# Altium footprint library IC.PcbLib: 220 footprints (part 10 of 14)
Each footprint in its own frame and in the unit in brackets; x right, y up, seen from the top. Pads: shape width x height; smd on the part's side, far side on the other; paste and mask are expansions set on the pad; w line width, h text height; cw(c..) or ccw(c..) is an arc to the next point about the centre after c.
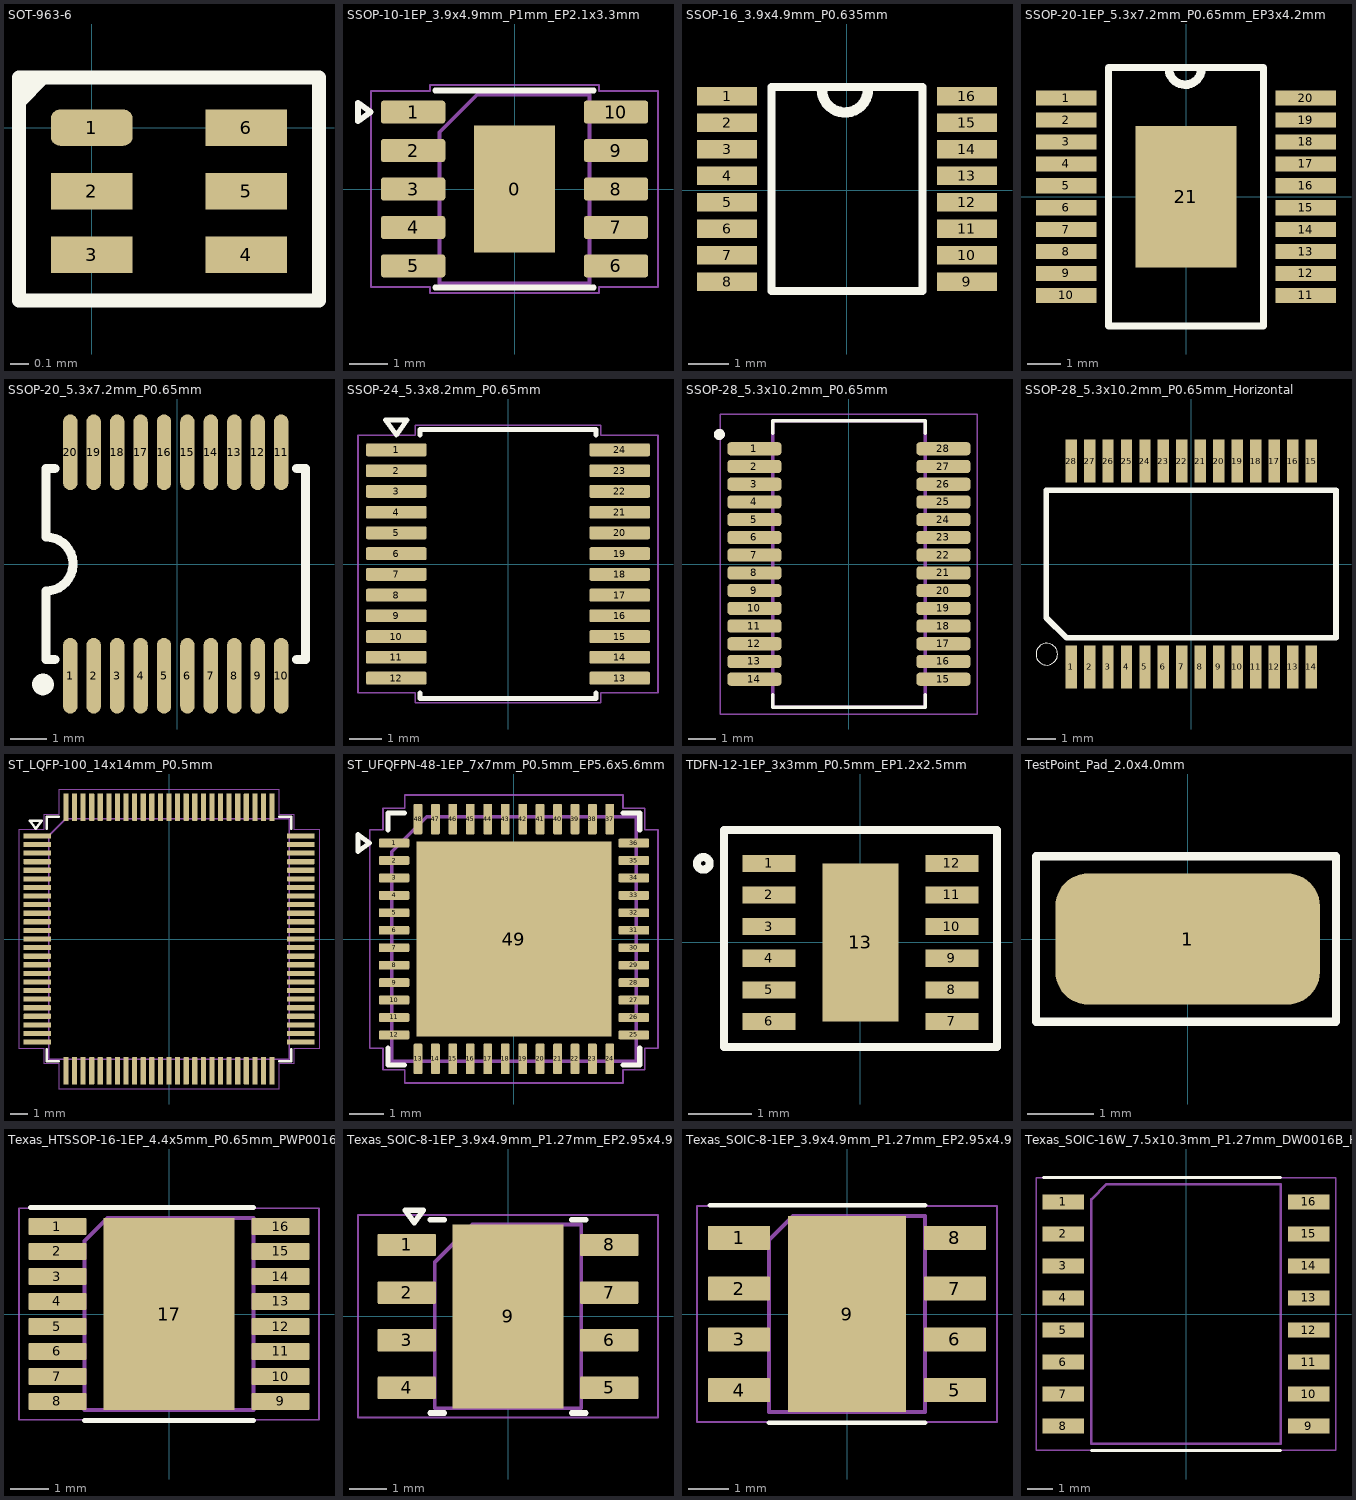
[diagram p9: the footprints below, top view; thin cyan lines are the x and y axes]

## SOT-963-6 [mm] "SOT-963 6-pin ultra-small package, pitch 0.35mm"
height 0.4
pads (6):
  rrect50% 0.45x0.2 smd paste+0 mask+0.051: 1(0,0)
  rect 0.45x0.2 smd paste+0 mask+0.051: 2(0,-0.35) 3(0,-0.7) 4(0.85,-0.7) 5(0.85,-0.35) 6(0.85,0)
Top Overlay:
  region: -0.4,0.275 -0.216,0.275 -0.4,0.091
  lines w0.076: -0.4,-0.95 -0.4,0.275 1.25,0.275 1.25,-0.95 -0.4,-0.95
3D body "SOT-963-6.step": height 0.5, standoff 0, extent -0.18,-0.85 1.03,0.15

## SSOP-10-1EP_3.9x4.9mm_P1mm_EP2.1x3.3mm [mm] "CH224K, USB PD sink controller — IC kích điện áp sạc nhanh USB PD [IC kich dien ap sac nhanh USB PD]"
height 1.55
pads (11):
  rect 2.1x3.3 smd paste-3.3: 0(0,0)
  rrect25% 1.675x0.6 smd: 1(-2.638,2) 2(-2.638,1) 3(-2.638,0) 4(-2.638,-1) 5(-2.638,-2) 6(2.638,-2) 7(2.638,-1) 8(2.638,0) 9(2.638,1) 10(2.638,2)
Top Overlay:
  lines w0.15: -2.06,-2.56 2.06,-2.56 ; -2.06,2.56 2.06,2.56 ; -4.07,1.76 -3.74,2 -4.07,2.24 -4.07,1.76
Top Paste:
  region: -0.845,-1.33 0.845,-1.33 0.845,1.33 -0.845,1.33
Mechanical 2:
  lines w0.1: -1.95,-2.45 1.95,-2.45 1.95,2.45 -0.975,2.45 -1.95,1.475 -1.95,-2.45
Mechanical 4:
  lines w0.05: -3.73,-2.55 -3.73,2.55 -2.2,2.55 -2.2,2.7 2.2,2.7 2.2,2.55 3.73,2.55 3.73,-2.55 2.2,-2.55 2.2,-2.7 -2.2,-2.7 -2.2,-2.55 -3.73,-2.55
3D body "SSOP-10-1EP_3.9x4.9mm_P1mm_EP2.1x3.3mm.step": height 0, standoff 0, extent -3.475,-2.3 3.475,2.3

## SSOP-16_3.9x4.9mm_P0.635mm [mm] "SSOP-16 / QSOP-16 (DBQ), body 3.9x4.9mm, pitch 0.635mm"
height 2.65
pads (16):
  rect 1.475x0.45 smd: 1(-2.938,2.3) 2(-2.938,1.65) 3(-2.938,1) 4(-2.938,0.35) 5(-2.938,-0.3) 6(-2.938,-0.95) 7(-2.938,-1.6) 8(-2.938,-2.25) 9(2.938,-2.25) 10(2.938,-1.6) 11(2.938,-0.95) 12(2.938,-0.3) 13(2.938,0.35) 14(2.938,1) 15(2.938,1.65) 16(2.938,2.3)
Top Overlay:
  lines w0.2: -1.85,-2.475 -1.85,2.525 1.85,2.525 1.85,-2.475 -1.85,-2.475
  lines w0.254: -0.615,2.464 ccw(c-0.051,2.464) 0.513,2.483
3D body "NPIC6C596APWJ.stp": height 1.1, standoff 0, extent -3.2,-2.474 3.2,2.526

## SSOP-20-1EP_5.3x7.2mm_P0.65mm_EP3x4.2mm [mm] "SSOP-20 with exposed pad 3.0x4.2mm, pitch 0.65mm"
height 1.1
pads (21):
  rect 1.8x0.45 smd mask+0.076: 1(-3.55,2.925) 2(-3.55,2.275) 3(-3.55,1.625) 4(-3.55,0.975) 5(-3.55,0.325) 6(-3.55,-0.325) 7(-3.55,-0.975) 8(-3.55,-1.625) 9(-3.55,-2.275) 10(-3.55,-2.925) 11(3.55,-2.925) 12(3.55,-2.275) 13(3.55,-1.625) 14(3.55,-0.975) 15(3.55,-0.325) 16(3.55,0.325) 17(3.55,0.975) 18(3.55,1.625) 19(3.55,2.275) 20(3.55,2.925)
  rect 3x4.2 smd: 21(0,0)
Top Overlay:
  lines w0.2: -2.3,-3.835 -2.3,3.835 2.3,3.835 2.3,-3.835 -2.3,-3.835
  lines w0.254: -0.51,3.783 ccw(c-0.025,3.81) 0.458,3.768
3D body "MTCH108-I_SS.stp": height 2, standoff 0, extent -3.9,-3.6 3.9,3.6

## SSOP-20_5.3x7.2mm_P0.65mm [mm] "SSOP-20, body 5.3x7.2mm, pitch 0.65mm"
pads (20):
  oval 0.4x2.1 smd: 1(-2.973,-3.1) 2(-2.322,-3.1) 3(-1.672,-3.1) 4(-1.022,-3.1) 5(-0.372,-3.1) 6(0.279,-3.1) 7(0.929,-3.1) 8(1.579,-3.1) 9(2.229,-3.1) 10(2.879,-3.1) 11(2.879,3.1) 12(2.229,3.1) 13(1.579,3.1) 14(0.929,3.1) 15(0.279,3.1) 16(-0.372,3.1) 17(-1.022,3.1) 18(-1.672,3.1) 19(-2.322,3.1) 20(-2.973,3.1)
Top Overlay:
  lines w0.254: -3.647,-0.75 -3.647,-2.65 -3.404,-2.65 ; -3.646,-0.749 ccw(c-3.646,0) -3.647,0.75 -3.647,2.65 -3.404,2.65 ; 3.311,-2.65 3.553,-2.65 3.553,2.65 3.311,2.65
  lines w0.3: -3.841,-3.444 cw(c-3.73,-3.343) -3.831,-3.454
3D body "SSOP20L-150-0.64.STEP": height 1.63, standoff 0, extent -3.725,-2.997 3.725,2.997

## SSOP-24_5.3x8.2mm_P0.65mm [mm] "SSOP-24 5.3x8.2mm pitch 0.65mm (TB6612FNG)"
height 2.1
pads (24):
  rrect25% 1.9x0.4 smd: 1(-3.5,3.575) 2(-3.5,2.925) 3(-3.5,2.275) 4(-3.5,1.625) 5(-3.5,0.975) 6(-3.5,0.325) 7(-3.5,-0.325) 8(-3.5,-0.975) 9(-3.5,-1.625) 10(-3.5,-2.275) 11(-3.5,-2.925) 12(-3.5,-3.575) 13(3.5,-3.575) 14(3.5,-2.925) 15(3.5,-2.275) 16(3.5,-1.625) 17(3.5,-0.975) 18(3.5,-0.325) 19(3.5,0.325) 20(3.5,0.975) 21(3.5,1.625) 22(3.5,2.275) 23(3.5,2.925) 24(3.5,3.575)
Top Overlay:
  lines w0.15: -2.76,-4.035 -2.76,-4.21 2.76,-4.21 2.76,-4.035 ; -2.76,4.035 -2.76,4.21 2.76,4.21 2.76,4.035 ; -3.84,4.51 -3.5,4.04 -3.16,4.51 -3.84,4.51
Mechanical 4:
  lines w0.05: -4.7,-4.03 -4.7,4.03 -2.9,4.03 -2.9,4.35 2.9,4.35 2.9,4.03 4.7,4.03 4.7,-4.03 2.9,-4.03 2.9,-4.35 -2.9,-4.35 -2.9,-4.03 -4.7,-4.03
3D body "SSOP-24_5.3x8.2mm_P0.65mm.step": height 2.1, standoff 0, extent -3.9,-4.1 3.9,4.1

## SSOP-28_5.3x10.2mm_P0.65mm [mm] "SSOP-28, body 5.3x10.2mm, pitch 0.65mm (WM8731)"
pads (28):
  rrect50% 1.98x0.48 smd: 1(-3.465,4.225) 2(-3.465,3.575) 3(-3.465,2.925) 4(-3.465,2.275) 5(-3.465,1.625) 6(-3.465,0.975) 7(-3.465,0.325) 8(-3.465,-0.325) 9(-3.465,-0.975) 10(-3.465,-1.625) 11(-3.465,-2.275) 12(-3.465,-2.925) 13(-3.465,-3.575) 14(-3.465,-4.225) 15(3.465,-4.225) 16(3.465,-3.575) 17(3.465,-2.925) 18(3.465,-2.275) 19(3.465,-1.625) 20(3.465,-0.975) 21(3.465,-0.325) 22(3.465,0.325) 23(3.465,0.975) 24(3.465,1.625) 25(3.465,2.275) 26(3.465,2.925) 27(3.465,3.575) 28(3.465,4.225)
Top Overlay:
  circle w0.2: c-4.75,4.75 r0.1
  lines w0.127: -2.8,-4.8 -2.8,-5.25 2.8,-5.25 2.8,-4.8 ; -2.8,4.8 -2.8,5.25 2.8,5.25 2.8,4.8
Mechanical 13:
  circle w0.2: c-4.75,4.75 r0.1
  lines w0.127: -2.8,-5.25 2.8,-5.25 2.8,5.25 -2.8,5.25 -2.8,-5.25
Mechanical 15:
  lines w0.05: -4.71,-5.5 4.71,-5.5 4.71,5.5 -4.71,5.5 -4.71,-5.5
3D body "step_temp.STEP": height 2, standoff 0, extent -3.9,-5.1 3.9,5.1

## SSOP-28_5.3x10.2mm_P0.65mm_Horizontal [mm] "SSOP-28 rotated 90deg, body 5.3x10.2mm, pitch 0.65mm (FT232RL)"
pads (28):
  rect 0.4x1.5 smd: 1(-4.225,-3.625) 2(-3.575,-3.625) 3(-2.925,-3.625) 4(-2.275,-3.625) 5(-1.625,-3.625) 6(-0.975,-3.625) 7(-0.325,-3.625) 8(0.325,-3.625) 9(0.975,-3.625) 10(1.625,-3.625) 11(2.275,-3.625) 12(2.925,-3.625) 13(3.575,-3.625) 14(4.225,-3.625) 15(4.225,3.625) 16(3.575,3.625) 17(2.925,3.625) 18(2.275,3.625) 19(1.625,3.625) 20(0.975,3.625) 21(0.325,3.625) 22(-0.325,3.625) 23(-0.975,3.625) 24(-1.625,3.625) 25(-2.275,3.625) 26(-2.925,3.625) 27(-3.575,3.625) 28(-4.225,3.625)
Top Overlay:
  circle w0: c-5.08,-3.175 r0.381
  lines w0.203: -5.1,-1.89 -5.1,2.6 5.1,2.6 5.1,-2.6 -4.39,-2.6 -5.1,-1.89
3D body "FT232RL--3DModel-STEP-56544.STEP": height 2, standoff 0, extent -5.1,-3.9 5.1,3.9

## ST_LQFP-100_14x14mm_P0.5mm [mm] "STM32H743VIT6, Cortex-M7 MCU with 2 MB flash — Vi điều khiển Cortex-M7, flash 2 MB [Vi dieu khien Cortex-M7, flash 2 MB]"
height 1.4
pads (100):
  rrect25% 1.6x0.3 smd: 1(-7.675,6) 2(-7.675,5.5) 3(-7.675,5) 4(-7.675,4.5) 5(-7.675,4) 6(-7.675,3.5) 7(-7.675,3) 8(-7.675,2.5) 9(-7.675,2) 10(-7.675,1.5) 11(-7.675,1) 12(-7.675,0.5) 13(-7.675,0) 14(-7.675,-0.5) 15(-7.675,-1) 16(-7.675,-1.5) 17(-7.675,-2) 18(-7.675,-2.5) 19(-7.675,-3) 20(-7.675,-3.5) 21(-7.675,-4) 22(-7.675,-4.5) 23(-7.675,-5) 24(-7.675,-5.5) 25(-7.675,-6) 51(7.675,-6) 52(7.675,-5.5) 53(7.675,-5) 54(7.675,-4.5) 55(7.675,-4) 56(7.675,-3.5) 57(7.675,-3) 58(7.675,-2.5) 59(7.675,-2) 60(7.675,-1.5) 61(7.675,-1) 62(7.675,-0.5) 63(7.675,0) 64(7.675,0.5) 65(7.675,1) 66(7.675,1.5) 67(7.675,2) 68(7.675,2.5) 69(7.675,3) 70(7.675,3.5) 71(7.675,4) 72(7.675,4.5) 73(7.675,5) 74(7.675,5.5) 75(7.675,6)
  rrect25% 0.3x1.6 smd: 26(-6,-7.675) 27(-5.5,-7.675) 28(-5,-7.675) 29(-4.5,-7.675) 30(-4,-7.675) 31(-3.5,-7.675) 32(-3,-7.675) 33(-2.5,-7.675) 34(-2,-7.675) 35(-1.5,-7.675) 36(-1,-7.675) 37(-0.5,-7.675) 38(0,-7.675) 39(0.5,-7.675) 40(1,-7.675) 41(1.5,-7.675) 42(2,-7.675) 43(2.5,-7.675) 44(3,-7.675) 45(3.5,-7.675) 46(4,-7.675) 47(4.5,-7.675) 48(5,-7.675) 49(5.5,-7.675) 50(6,-7.675) 76(6,7.675) 77(5.5,7.675) 78(5,7.675) 79(4.5,7.675) 80(4,7.675) 81(3.5,7.675) 82(3,7.675) 83(2.5,7.675) 84(2,7.675) 85(1.5,7.675) 86(1,7.675) 87(0.5,7.675) 88(0,7.675) 89(-0.5,7.675) 90(-1,7.675) 91(-1.5,7.675) 92(-2,7.675) 93(-2.5,7.675) 94(-3,7.675) 95(-3.5,7.675) 96(-4,7.675) 97(-4.5,7.675) 98(-5,7.675) 99(-5.5,7.675) 100(-6,7.675)
Top Overlay:
  lines w0.15: -7.11,-6.41 -7.11,-7.11 -6.41,-7.11 ; -7.11,6.41 -7.11,7.11 -6.41,7.11 ; 6.41,-7.11 7.11,-7.11 7.11,-6.41 ; 6.41,7.11 7.11,7.11 7.11,6.41 ; -8.09,6.88 -7.75,6.41 -7.41,6.88 -8.09,6.88
Mechanical 2:
  lines w0.1: -7,-7 7,-7 7,7 -6,7 -7,6 -7,-7
Mechanical 4:
  lines w0.05: -8.73,-6.4 -8.73,6.4 -7.25,6.4 -7.25,7.25 -6.4,7.25 -6.4,8.73 6.4,8.73 6.4,7.25 7.25,7.25 7.25,6.4 8.73,6.4 8.73,-6.4 7.25,-6.4 7.25,-7.25 6.4,-7.25 6.4,-8.73 -6.4,-8.73 -6.4,-7.25 -7.25,-7.25 -7.25,-6.4 -8.73,-6.4
3D body "ST_LQFP-100_14x14mm_P0.5mm.step": height 0, standoff 0, extent -8.475,-8.475 8.475,8.475

## ST_UFQFPN-48-1EP_7x7mm_P0.5mm_EP5.6x5.6mm [mm] "STM32G431CBU6, Cortex-M4 MCU with 128 KB flash and motor-control timers — Vi điều khiển Cortex-M4, flash 128 KB, bộ định thời điều khiển động cơ [Vi dieu khien Cortex-M4, flash 128 KB, bo dinh thoi dieu khien dong co]"
height 0.55
pads (49):
  rrect25% 0.875x0.25 smd: 1(-3.437,2.75) 2(-3.437,2.25) 3(-3.437,1.75) 4(-3.437,1.25) 5(-3.437,0.75) 6(-3.437,0.25) 7(-3.437,-0.25) 8(-3.437,-0.75) 9(-3.437,-1.25) 10(-3.437,-1.75) 11(-3.437,-2.25) 12(-3.437,-2.75) 25(3.437,-2.75) 26(3.437,-2.25) 27(3.437,-1.75) 28(3.437,-1.25) 29(3.437,-0.75) 30(3.437,-0.25) 31(3.437,0.25) 32(3.437,0.75) 33(3.437,1.25) 34(3.437,1.75) 35(3.437,2.25) 36(3.437,2.75)
  rrect25% 0.25x0.875 smd: 13(-2.75,-3.437) 14(-2.25,-3.437) 15(-1.75,-3.437) 16(-1.25,-3.437) 17(-0.75,-3.437) 18(-0.25,-3.437) 19(0.25,-3.437) 20(0.75,-3.437) 21(1.25,-3.437) 22(1.75,-3.437) 23(2.25,-3.437) 24(2.75,-3.437) 37(2.75,3.437) 38(2.25,3.437) 39(1.75,3.437) 40(1.25,3.437) 41(0.75,3.437) 42(0.25,3.437) 43(-0.25,3.437) 44(-0.75,3.437) 45(-1.25,3.437) 46(-1.75,3.437) 47(-2.25,3.437) 48(-2.75,3.437)
  rect 5.6x5.6 smd paste-5.6: 49(0,0)
Top Overlay:
  lines w0.15: -3.61,-3.135 -3.61,-3.61 -3.135,-3.61 ; -3.61,3.135 -3.61,3.61 -3.135,3.61 ; 3.135,-3.61 3.61,-3.61 3.61,-3.135 ; 3.135,3.61 3.61,3.61 3.61,3.135 ; -4.47,2.51 -4.14,2.75 -4.47,2.99 -4.47,2.51
Top Paste:
  region: -2.665,1.535 -1.535,1.535 -1.535,2.665 -2.665,2.665
  region: -2.665,0.135 -1.535,0.135 -1.535,1.265 -2.665,1.265
  region: -2.665,-1.265 -1.535,-1.265 -1.535,-0.135 -2.665,-0.135
  region: -2.665,-2.665 -1.535,-2.665 -1.535,-1.535 -2.665,-1.535
  region: -1.265,1.535 -0.135,1.535 -0.135,2.665 -1.265,2.665
  region: -1.265,0.135 -0.135,0.135 -0.135,1.265 -1.265,1.265
  region: -1.265,-1.265 -0.135,-1.265 -0.135,-0.135 -1.265,-0.135
  region: -1.265,-2.665 -0.135,-2.665 -0.135,-1.535 -1.265,-1.535
  region: 0.135,1.535 1.265,1.535 1.265,2.665 0.135,2.665
  region: 0.135,0.135 1.265,0.135 1.265,1.265 0.135,1.265
  region: 0.135,-1.265 1.265,-1.265 1.265,-0.135 0.135,-0.135
  region: 0.135,-2.665 1.265,-2.665 1.265,-1.535 0.135,-1.535
  region: 1.535,1.535 2.665,1.535 2.665,2.665 1.535,2.665
  region: 1.535,0.135 2.665,0.135 2.665,1.265 1.535,1.265
  region: 1.535,-1.265 2.665,-1.265 2.665,-0.135 1.535,-0.135
  region: 1.535,-2.665 2.665,-2.665 2.665,-1.535 1.535,-1.535
Mechanical 2:
  lines w0.1: -3.5,-3.5 3.5,-3.5 3.5,3.5 -2.5,3.5 -3.5,2.5 -3.5,-3.5
Mechanical 4:
  lines w0.05: -4.13,-3.13 -4.13,3.13 -3.75,3.13 -3.75,3.75 -3.13,3.75 -3.13,4.13 3.13,4.13 3.13,3.75 3.75,3.75 3.75,3.13 4.13,3.13 4.13,-3.13 3.75,-3.13 3.75,-3.75 3.13,-3.75 3.13,-4.13 -3.13,-4.13 -3.13,-3.75 -3.75,-3.75 -3.75,-3.13 -4.13,-3.13
3D body "ST_UFQFPN-48-1EP_7x7mm_P0.5mm_EP5.6x5.6mm.step": height 0, standoff 0, extent -3.875,-3.875 3.875,3.875

## TDFN-12-1EP_3x3mm_P0.5mm_EP1.2x2.5mm [mm] "TDFN-12 with exposed pad 1.2x2.5mm, body 3x3mm, pitch 0.5mm"
height 0.5
pads (13):
  rect 0.84x0.27 smd mask+0.076: 1(-1.445,1.25) 2(-1.445,0.75) 3(-1.445,0.25) 4(-1.445,-0.25) 5(-1.445,-0.75) 6(-1.445,-1.25) 7(1.445,-1.25) 8(1.445,-0.75) 9(1.445,-0.25) 10(1.445,0.25) 11(1.445,0.75) 12(1.445,1.25)
  rect 1.2x2.5 smd mask+0.076: 13(0,0)
Top Overlay:
  circle w0.127: c-2.485,1.25 r0.1
  lines w0.127: -2.159,-1.651 2.159,-1.651 2.159,1.778 -2.159,1.778 -2.159,-1.27 -2.159,-1.651
Top Paste:
  region: -0.54,0.79 0.54,0.79 0.54,-0.79 -0.54,-0.79
3D body "User Library-TDFN-12-EP-3x3-05.STEP": height 0.75, standoff 0, extent -1.5,-1.5 1.5,1.5

## TestPoint_Pad_2.0x4.0mm [mil] "Single rectangular SMD solder pad, 2.0x4.0mm (78x157mil)"
pads (1):
  rrect50% 157x78 smd: 1(0,0)
Top Overlay:
  lines w5: -90,-49 -90,49 88,49 88,-49 -90,-49

## Texas_HTSSOP-16-1EP_4.4x5mm_P0.65mm_PWP0016C [mm] "DRV8833PWPR, Dual H-bridge driver for two brushed DC motors or one stepper — Driver cầu H kép cho hai động cơ DC chổi than hoặc một động cơ bước [Driver cau H kep cho hai dong co DC choi than hoac mot dong co buoc]"
height 1.2
pads (17):
  rrect11% 1.5x0.45 smd: 1(-2.9,2.275) 2(-2.9,1.625) 3(-2.9,0.975) 4(-2.9,0.325) 5(-2.9,-0.325) 6(-2.9,-0.975) 7(-2.9,-1.625) 8(-2.9,-2.275) 9(2.9,-2.275) 10(2.9,-1.625) 11(2.9,-0.975) 12(2.9,-0.325) 13(2.9,0.325) 14(2.9,0.975) 15(2.9,1.625) 16(2.9,2.275)
  rect 3.4x5 smd paste-5 mask-5: 17(0,0)
Top Overlay:
  lines w0.12: -3.6,2.77 2.2,2.77 ; -2.2,-2.77 2.2,-2.77
  text ".Designator" at -2.2,2.95 h1
Top Paste:
  region: -1.23,-1.155 1.23,-1.155 1.23,1.155 -1.23,1.155
Top Solder:
  region: -1.23,-1.155 1.23,-1.155 1.23,1.155 -1.23,1.155
Mechanical 2:
  lines w0.1: -2.2,-2.5 2.2,-2.5 2.2,2.5 -1.6,2.5 -2.2,1.9 -2.2,-2.5
Mechanical 4:
  lines w0.05: -3.9,-2.75 3.9,-2.75 3.9,2.75 -3.9,2.75 -3.9,-2.75
3D body "Texas_HTSSOP-16-1EP_4.4x5mm_P0.65mm_PWP0016C.step": height 0, standoff 0, extent -3.65,-2.5 3.65,2.5

## Texas_SOIC-8-1EP_3.9x4.9mm_P1.27mm_EP2.95x4.9mm_DDA0008B [mm] "TPS5430DDA, 3 A step-down switching regulator, 5.5–36 V input — IC nguồn xung giảm áp 3 A, đầu vào 5,5–36 V [IC nguon xung giam ap 3 A, dau vao 5,5–36 V]"
height 1.65
pads (9):
  rrect8% 1.55x0.6 smd: 1(-2.7,1.905) 2(-2.7,0.635) 3(-2.7,-0.635) 4(-2.7,-1.905) 5(2.7,-1.905) 6(2.7,-0.635) 7(2.7,0.635) 8(2.7,1.905)
  rect 2.95x4.9 smd paste-3 mask-3: 9(0,0)
Top Overlay:
  lines w0.15: -2.075,-2.575 -1.7,-2.575 ; -2.075,2.575 -1.7,2.575 ; 1.7,-2.575 2.075,-2.575 ; 1.7,2.575 2.075,2.575 ; -2.74,2.83 -2.5,2.5 -2.26,2.83 -2.74,2.83
Top Paste:
  region: -1.355,-1.7 1.355,-1.7 1.355,1.7 -1.355,1.7
Top Solder:
  region: -1.355,-1.7 1.355,-1.7 1.355,1.7 -1.355,1.7
Mechanical 2:
  lines w0.1: -1.95,-2.45 -1.95,1.45 -0.95,2.45 1.95,2.45 1.95,-2.45 -1.95,-2.45
Mechanical 4:
  lines w0.05: -4,-2.7 -4,2.7 4,2.7 4,-2.7 -4,-2.7
3D body "Texas_SOIC-8-1EP_3.9x4.9mm_P1.27mm_EP2.95x4.9mm_DDA0008B.step": height 0, standoff 0, extent -3.475,-2.45 3.475,2.45

## Texas_SOIC-8-1EP_3.9x4.9mm_P1.27mm_EP2.95x4.9mm_Mask2.71x3.4mm [mm] "DRV8871DDAR, 3.6 A peak brushed DC motor H-bridge with current regulation — Driver cầu H động cơ DC chổi than, giới hạn dòng, đỉnh 3,6 A [Driver cau H dong co DC choi than, gioi han dong, dinh 3,6 A]"
height 1.7
pads (9):
  rrect8% 1.55x0.6 smd: 1(-2.7,1.905) 2(-2.7,0.635) 3(-2.7,-0.635) 4(-2.7,-1.905) 5(2.7,-1.905) 6(2.7,-0.635) 7(2.7,0.635) 8(2.7,1.905)
  rect 2.95x4.9 smd paste-4.9 mask-4.9: 9(0,0)
Top Overlay:
  lines w0.12: -3.425,2.72 1.95,2.72 ; -1.95,-2.72 1.95,-2.72
  text ".Designator" at -1.95,2.9 h1
Top Paste:
  region: -1.355,-1.7 1.355,-1.7 1.355,1.7 -1.355,1.7
Top Solder:
  region: -1.355,-1.7 1.355,-1.7 1.355,1.7 -1.355,1.7
Mechanical 2:
  lines w0.1: -1.95,-2.45 1.95,-2.45 1.95,2.45 -1.35,2.45 -1.95,1.85 -1.95,-2.45
Mechanical 4:
  lines w0.05: -3.75,-2.7 3.75,-2.7 3.75,2.7 -3.75,2.7 -3.75,-2.7
3D body "Texas_SOIC-8-1EP_3.9x4.9mm_P1.27mm_EP2.95x4.9mm_Mask2.71x3.4mm.step": height 0, standoff 0, extent -3.475,-2.45 3.475,2.45

## Texas_SOIC-16W_7.5x10.3mm_P1.27mm_DW0016B_HV [mm] "ISO7741DWR, Four-channel 3/1 digital isolator, 100 Mbps — Cách ly số bốn kênh 3 thuận 1 ngược, 100 Mbps [Cach ly so bon kenh 3 thuan 1 nguoc, 100 Mbps]"
height 2.65
pads (16):
  rrect8% 1.65x0.6 smd: 1(-4.875,4.445) 2(-4.875,3.175) 3(-4.875,1.905) 4(-4.875,0.635) 5(-4.875,-0.635) 6(-4.875,-1.905) 7(-4.875,-3.175) 8(-4.875,-4.445) 9(4.875,-4.445) 10(4.875,-3.175) 11(4.875,-1.905) 12(4.875,-0.635) 13(4.875,0.635) 14(4.875,1.905) 15(4.875,3.175) 16(4.875,4.445)
Top Overlay:
  lines w0.12: -5.65,5.42 3.75,5.42 ; -3.75,-5.42 3.75,-5.42
  text ".Designator" at -3.75,5.6 h1
Mechanical 2:
  lines w0.1: -3.75,-5.15 3.75,-5.15 3.75,5.15 -3.15,5.15 -3.75,4.55 -3.75,-5.15
Mechanical 4:
  lines w0.05: -5.95,-5.4 5.95,-5.4 5.95,5.4 -5.95,5.4 -5.95,-5.4
3D body "Texas_SOIC-16W_7.5x10.3mm_P1.27mm_DW0016B_HV.step": height 0, standoff 0, extent -5.7,-4.745 5.7,4.745